# Altium footprint library PcbLib.PcbLib: 428 footprints (part 21 of 27)
Each footprint in its own frame and in the unit in brackets; x right, y up, seen from the top. Pads: shape width x height; smd on the part's side, far side on the other; paste and mask are expansions set on the pad; w line width, h text height; cw(c..) or ccw(c..) is an arc to the next point about the centre after c.
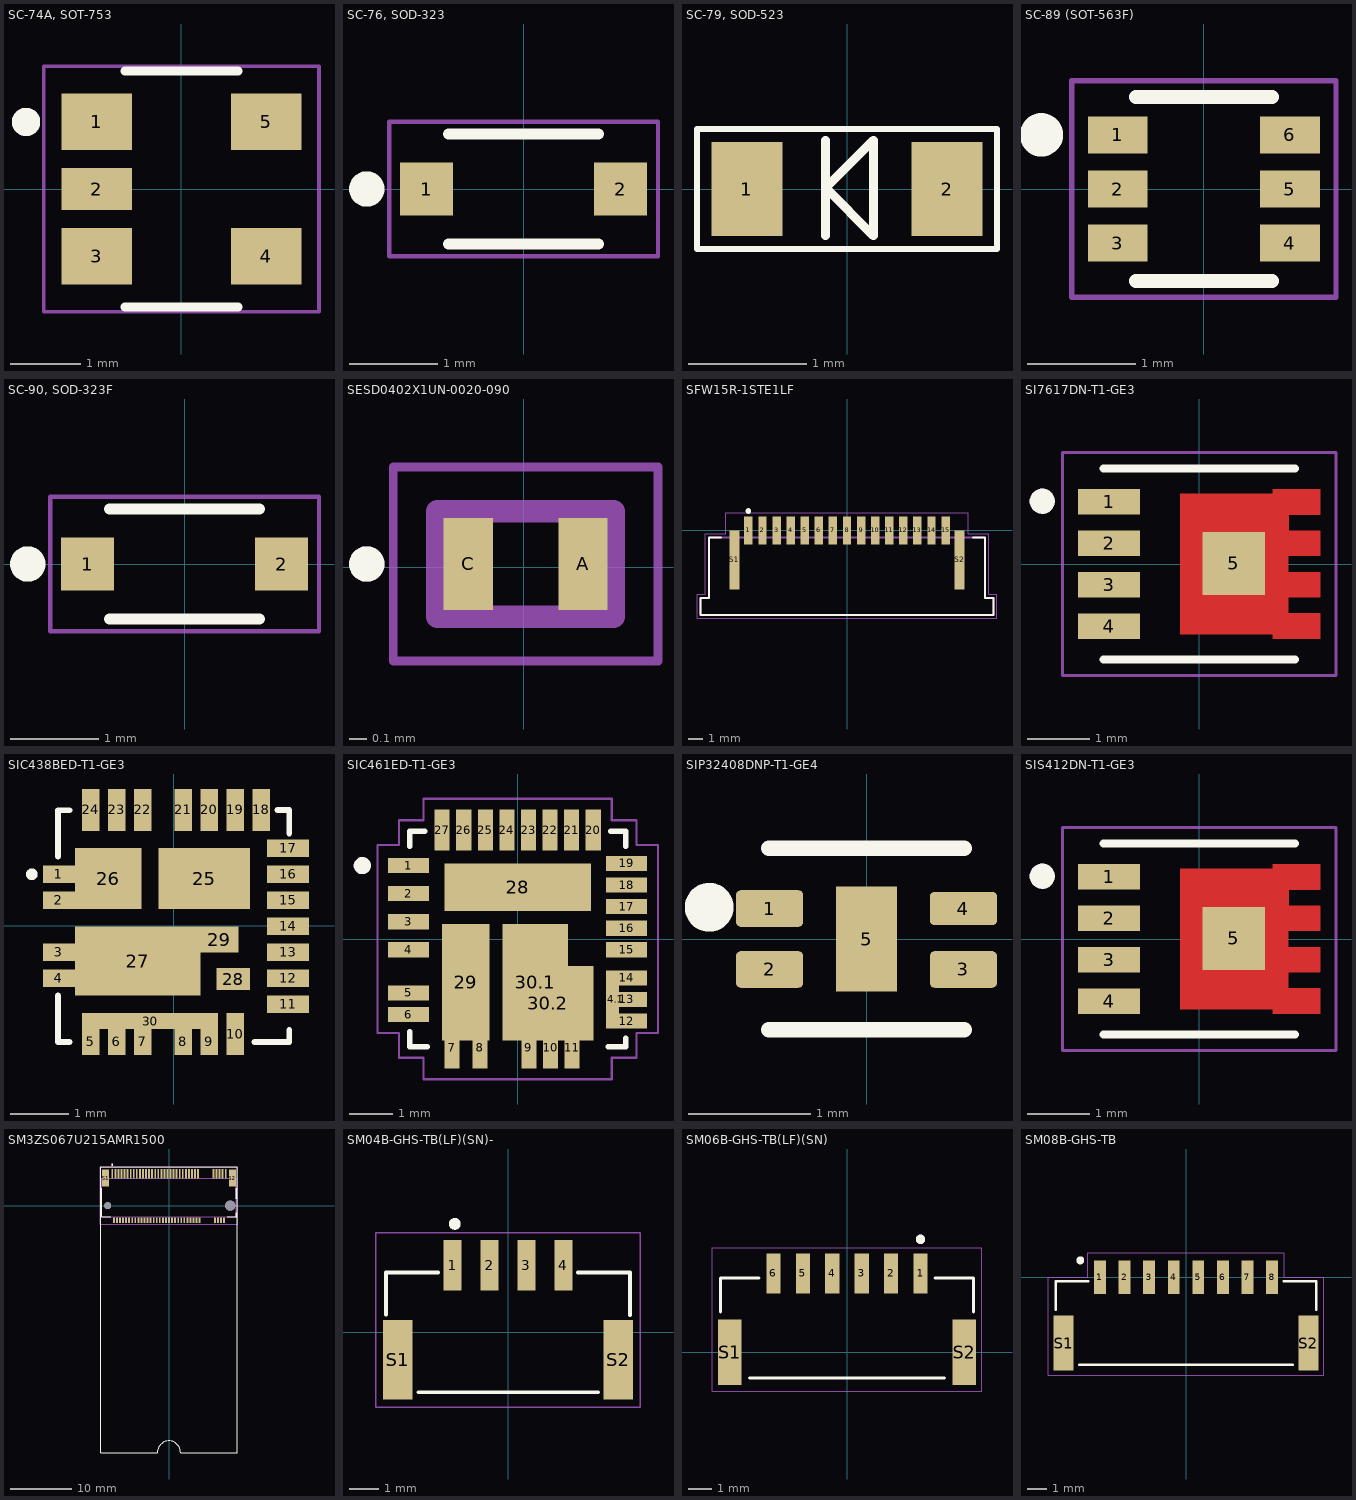
[diagram p20: the footprints below, top view; thin cyan lines are the x and y axes]

## SC-74A, SOT-753 [mm]
pads (5):
  rect 1x0.8 smd: 1(-1.2,0.95) 3(-1.2,-0.95) 4(1.2,-0.95) 5(1.2,0.95)
  rect 1x0.6 smd: 2(-1.2,0)
Top Overlay:
  circle w0.2: c-2.2,0.95 r0.1
  lines w0.127: -0.8,-1.67 0.8,-1.67 ; -0.8,1.67 0.8,1.67
Mechanical 13:
  circle w0.2: c-2.2,0.95 r0.1
Mechanical 15:
  lines w0.05: -1.95,-1.74 1.95,-1.74 1.95,1.74 -1.95,1.74 -1.95,-1.74
3D body "step_temp.STEP": height 1.3, standoff 0, extent -1.45,-1.4 1.45,1.4

## SC-76, SOD-323 [mm]
pads (2):
  rect 0.6x0.6 smd paste-1: 1(-1.1,0) 2(1.1,0)
Top Overlay:
  circle w0.2: c-1.778,0 r0.1
  lines w0.127: -0.85,-0.625 0.85,-0.625 ; -0.85,0.625 0.85,0.625
Top Paste:
  region: -0.85,-0.25 -1.35,-0.25 -1.35,0.25 -0.85,0.25
  region: 1.35,-0.25 0.85,-0.25 0.85,0.25 1.35,0.25
Mechanical 15:
  lines w0.05: -1.524,-0.762 -1.524,0.762 1.524,0.762 1.524,-0.762 -1.524,-0.762
3D body "User Library-SOD323.STEP": height 1, standoff 0.01, extent -1.275,-0.615 1.225,0.635

## SC-79, SOD-523 [mm]
pads (2):
  rect 0.6x0.8 smd: 1(-0.847,0) 2(0.847,0)
Top Overlay:
  lines w0.05: -1.27,-0.508 -1.27,0.508 1.27,0.508 1.27,-0.508 -1.27,-0.508
  lines w0.076: -0.182,-0.395 -0.182,0.413 ; -0.182,0.009 0.222,0.413 0.222,-0.395 -0.182,0.009
3D body "step_temp.STEP": height 0.7, standoff 0, extent -0.8,-0.4 0.8,0.4

## SC-89 (SOT-563F) [mm]
pads (6):
  rect 0.55x0.34 smd: 1(-0.795,0.5) 2(-0.795,0) 3(-0.795,-0.5) 4(0.795,-0.5) 5(0.795,0) 6(0.795,0.5)
Top Overlay:
  circle w0.3: c-1.5,0.5 r0.05
  lines w0.127: -0.63,-0.85 0.63,-0.85 ; -0.63,0.85 0.63,0.85
Mechanical 15:
  lines w0.05: -1.22,-1 1.22,-1 1.22,1 -1.22,1 -1.22,-1
3D body "DMG1024UV-7.STEP": height 0.6, standoff 0, extent -0.795,-0.82 0.805,0.78

## SC-90, SOD-323F [mm]
pads (2):
  rect 0.6x0.6 smd paste-1: 1(-1.1,0) 2(1.1,0)
Top Overlay:
  circle w0.2: c-1.778,0 r0.1
  lines w0.127: -0.85,-0.625 0.85,-0.625 ; -0.85,0.625 0.85,0.625
Top Paste:
  region: -0.85,-0.25 -1.35,-0.25 -1.35,0.25 -0.85,0.25
  region: 1.35,-0.25 0.85,-0.25 0.85,0.25 1.35,0.25
Mechanical 15:
  lines w0.05: -1.524,-0.762 -1.524,0.762 1.524,0.762 1.524,-0.762 -1.524,-0.762
3D body "step_temp.STEP": height 0.8, standoff 0, extent -1.25,-0.625 1.25,0.625

## SESD0402X1UN-0020-090 [mm]
pads (2):
  rect 0.28x0.52 smd: A(0.336,0.017) C(-0.314,0.017)
Top Overlay:
  circle w0.1: c-0.889,0.017 r0.05
Mechanical 13:
  circle w0.1: c-0.889,0.017 r0.05
  lines w0.127: -0.489,-0.283 0.511,-0.283 0.511,0.317 -0.489,0.317 -0.489,-0.283
Mechanical 15:
  lines w0.05: -0.739,-0.533 -0.739,0.567 0.761,0.567 0.761,-0.533 -0.739,-0.533
3D body "step_temp.STEP": height 0.43, standoff 0, extent -0.489,-0.283 0.511,0.317

## SFW15R-1STE1LF [mm]
pads (17):
  rect 0.6x2 smd: 1(-7,0) 2(-6,0) 3(-5,0) 4(-4,0) 5(-3,0) 6(-2,0) 7(-1,0) 8(0,0) 9(1,0) 10(2,0) 11(3,0) 12(4,0) 13(5,0) 14(6,0) 15(7,0)
  rect 0.7x4.2 smd: S1(-8,-2.1) S2(8,-2.1)
Top Overlay:
  circle w0.2: c-7,1.373 r0.1
  lines w0.127: -8.946,-0.5 -9.8,-0.5 -9.8,-4.8 -10.4,-4.8 -10.4,-6 10.4,-6 10.4,-4.8 9.8,-4.8 9.8,-0.5 8.946,-0.5
Mechanical 13:
  lines w0.127: -10.4,-6 10.4,-6 10.4,-4.8 9.8,-4.8 9.8,-0.5 -9.8,-0.5 -9.8,-4.8 -10.4,-4.8 -10.4,-6
Mechanical 15:
  lines w0.05: -10.65,-6.25 10.65,-6.25 10.65,-4.55 10.05,-4.55 10.05,-0.25 8.6,-0.25 8.6,1.25 -8.6,1.25 -8.6,-0.25 -10.05,-0.25 -10.05,-4.55 -10.65,-4.55 -10.65,-6.25
3D body "SFW15R-1STE1LF--3DModel-STEP-533217.STEP": height 2.79, standoff 0.09, extent -10.4,-6 10.4,0.5

## SI7617DN-T1-GE3 [mm]
height 1.12
pads (5):
  rect 0.99x0.405 smd: 1(-1.435,0.99) 2(-1.435,0.33) 3(-1.435,-0.33) 4(-1.435,-0.99)
  rect 1x1 smd paste-1 mask+0: 5(0.55,0.01)
Top Layer:
  region: 1.93,0.787 1.425,0.787 1.425,0.533 1.93,0.533 1.93,0.128 1.42,0.128 1.42,-0.128 1.93,-0.128 1.93,-0.533 1.42,-0.533 1.42,-0.787 1.93,-0.787 1.93,-1.195 1.17,-1.195 1.17,-1.118 -0.305,-1.118 -0.305,1.118 1.17,1.118 1.17,1.195 1.93,1.195
Top Overlay:
  circle w0.2: c-2.5,1 r0.1
  lines w0.127: -1.525,-1.525 1.525,-1.525 ; -1.525,1.525 1.525,1.525
Top Paste:
  region: 1.93,-0.533 1.17,-0.533 1.17,-0.128 1.93,-0.128
  region: 1.93,0.128 1.17,0.128 1.17,0.533 1.93,0.533
  region: 1.93,0.787 1.17,0.787 1.17,1.195 1.93,1.195
  region: 1.93,-1.195 1.17,-1.195 1.17,-0.787 1.93,-0.787
  region: 0.913,0.085 -0.048,0.085 -0.048,0.945 0.913,0.945
  region: 0.913,-0.945 -0.048,-0.945 -0.048,-0.085 0.913,-0.085
Top Solder:
  region: 1.98,0.737 1.475,0.737 1.475,0.583 1.98,0.583 1.98,0.078 1.47,0.078 1.47,-0.078 1.98,-0.078 1.98,-0.583 1.47,-0.583 1.47,-0.737 1.98,-0.737 1.98,-1.245 1.12,-1.245 1.12,-1.168 -0.355,-1.168 -0.355,1.168 1.12,1.168 1.12,1.245 1.98,1.245
Mechanical 13:
  circle w0.2: c-2.5,1 r0.1
Mechanical 15:
  lines w0.05: -2.18,-1.775 2.18,-1.775 2.18,1.775 -2.18,1.775 -2.18,-1.775
3D body "SIS412DN-T1-GE3.STEP": height 1.12, standoff 0, extent -1.651,-1.651 1.651,1.651

## SIC438BED-T1-GE3 [mm]
pads (30):
  rect 0.55x0.3 smd: 1(-1.981,0.894) 2(-1.981,0.444) 3(-1.981,-0.456) 4(-1.981,-0.906)
  rect 0.3x0.45 smd: 5(-1.431,-2.006) 6(-0.981,-2.006) 7(-0.531,-2.006) 8(0.169,-2.006) 9(0.619,-2.006)
  rect 0.3x0.725 smd: 10(1.069,-1.869) 18(1.519,2.006) 19(1.069,2.006) 20(0.619,2.006) 21(0.169,2.006) 22(-0.531,2.006) 23(-0.981,2.006) 24(-1.431,2.006)
  rect 0.725x0.3 smd: 11(1.981,-1.356) 12(1.981,-0.906) 13(1.981,-0.456) 14(1.981,-0.006) 15(1.981,0.444) 16(1.981,0.894) 17(1.981,1.344)
  rect 1.575x1.05 smd: 25(0.531,0.819)
  rect 1.15x1.05 smd: 26(-1.131,0.819)
  rect 2.175x1.2 smd: 27(-0.619,-0.606)
  rect 0.58x0.38 smd: 28(1.029,-0.921)
  rect 0.66x0.455 smd: 29(0.794,-0.234)
  rect 2.35x0.275 smd: 30(-0.406,-1.644)
Top Overlay:
  lines w0.1: -2,-1.2 -2,-2.006 -1.8,-2.006 ; -2,1.2 -2,2 -1.8,2 ; 1.4,-2.006 2,-2.006 2,-1.8 ; 1.8,2.006 2,2.006 2,1.6 ; -2.5,0.894 cw(c-2.45,0.894) -2.4,0.894 cw(c-2.45,0.894) -2.5,0.894
3D body "SIC437BED-T1-GE3.STEP": height 0.8, standoff 0, extent -1.975,-2 2.025,2

## SIC461ED-T1-GE3 [mm]
pads (32):
  rect 0.95x0.35 smd: 1(-2.525,1.7) 2(-2.525,1.05) 3(-2.525,0.4) 4(-2.525,-0.25) 5(-2.525,-1.25) 6(-2.525,-1.75) 12(2.525,-1.9) 13(2.525,-1.4) 14(2.525,-0.9) 15(2.525,-0.25) 16(2.525,0.25) 17(2.525,0.75) 18(2.525,1.25) 19(2.525,1.75)
  rect 0.35x0.95 smd: 7(-1.52,-2.525) 8(-0.87,-2.525) 9(0.26,-2.525) 10(0.76,-2.525) 11(1.26,-2.525) 20(1.75,2.525) 21(1.25,2.525) 22(0.75,2.525) 23(0.25,2.525) 24(-0.25,2.525) 25(-0.75,2.525) 26(-1.25,2.525) 27(-1.75,2.525)
  rect 0.3x1.35 smd: 14.1(2.2,-1.4)
  rect 3.4x1.1 smd: 28(0,1.2)
  rect 1.1x2.7 smd: 29(-1.2,-1)
  rect 1.52x2.7 smd: 30.1(0.41,-1)
  rect 2.1x1.73 smd: 30.2(0.7,-1.485)
Top Overlay:
  circle w0.2: c-3.6,1.7 r0.1
  lines w0.127: -2.5,-2.15 -2.5,-2.5 -2.1,-2.5 ; -2.5,2.15 -2.5,2.5 -2.15,2.5 ; 2.1,-2.5 2.5,-2.5 2.5,-2.3 ; 2.15,2.5 2.5,2.5 2.5,2.15
Mechanical 15:
  lines w0.05: -3.25,-2.18 -2.75,-2.18 -2.75,-2.75 -2.18,-2.75 -2.18,-3.25 2.18,-3.25 2.18,-2.75 2.75,-2.75 2.75,-2.18 3.25,-2.18 3.25,2.18 2.75,2.18 2.75,2.75 2.18,2.75 2.18,3.25 -2.18,3.25 -2.18,2.75 -2.75,2.75 -2.75,2.18 -3.25,2.18 -3.25,-2.18
3D body "SIC461ED-T1-GE3--3DModel-STEP-56544.STEP": height 0.8, standoff 0, extent -2.5,-2.5 2.5,2.5

## SIP32408DNP-T1-GE4 [mm]
pads (5):
  rrect25% 0.55x0.3 smd mask+0: 1(-0.795,0.25) 2(-0.795,-0.25) 3(0.795,-0.25)
  rrect25% 0.55x0.27 smd mask+0: 4(0.795,0.25)
  rect 0.5x0.86 smd paste-1 mask+0.05: 5(0,0)
Top Overlay:
  circle w0.2: c-1.29,0.26 r0.1
  lines w0.127: -0.8,-0.744 0.8,-0.744 ; -0.8,0.744 0.8,0.744
Top Paste:
  region: 0.16,-0.27 -0.16,-0.27 -0.16,0.27 0.16,0.27
3D body "TDFN_8DNP-T1-GE4_VIS.step": height 0.61, standoff 0, extent -0.836,-0.632 0.816,0.612

## SIS412DN-T1-GE3 [mm]
height 1.12
pads (5):
  rect 0.99x0.405 smd: 1(-1.435,0.99) 2(-1.435,0.33) 3(-1.435,-0.33) 4(-1.435,-0.99)
  rect 1x1 smd paste-1 mask+0: 5(0.55,0.01)
Top Layer:
  region: 1.93,0.787 1.425,0.787 1.425,0.533 1.93,0.533 1.93,0.128 1.42,0.128 1.42,-0.128 1.93,-0.128 1.93,-0.533 1.42,-0.533 1.42,-0.787 1.93,-0.787 1.93,-1.195 1.17,-1.195 1.17,-1.118 -0.305,-1.118 -0.305,1.118 1.17,1.118 1.17,1.195 1.93,1.195
Top Overlay:
  circle w0.2: c-2.5,1 r0.1
  lines w0.127: -1.525,-1.525 1.525,-1.525 ; -1.525,1.525 1.525,1.525
Top Paste:
  region: 0.913,-0.945 -0.048,-0.945 -0.048,-0.085 0.913,-0.085
  region: 0.913,0.085 -0.048,0.085 -0.048,0.945 0.913,0.945
  region: 1.93,-1.195 1.17,-1.195 1.17,-0.787 1.93,-0.787
  region: 1.93,0.787 1.17,0.787 1.17,1.195 1.93,1.195
  region: 1.93,0.128 1.17,0.128 1.17,0.533 1.93,0.533
  region: 1.93,-0.533 1.17,-0.533 1.17,-0.128 1.93,-0.128
Top Solder:
  region: 1.98,0.737 1.475,0.737 1.475,0.583 1.98,0.583 1.98,0.078 1.47,0.078 1.47,-0.078 1.98,-0.078 1.98,-0.583 1.47,-0.583 1.47,-0.737 1.98,-0.737 1.98,-1.245 1.12,-1.245 1.12,-1.168 -0.355,-1.168 -0.355,1.168 1.12,1.168 1.12,1.245 1.98,1.245
Mechanical 13:
  circle w0.2: c-2.5,1 r0.1
Mechanical 15:
  lines w0.05: -2.18,-1.775 -2.18,1.775 2.18,1.775 2.18,-1.775 -2.18,-1.775
3D body "SIS412DN-T1-GE3.STEP": height 1.12, standoff 0, extent -1.651,-1.651 1.651,1.651

## SM3ZS067U215AMR1500 [mm]
height 2.25
pads (71):
  rect 0.3x1.55 smd: 1(-9.25,5.225) 3(-8.75,5.225) 5(-8.25,5.225) 7(-7.75,5.225) 9(-7.25,5.225) 11(-6.75,5.225) 13(-6.25,5.225) 15(-5.75,5.225) 17(-5.25,5.225) 19(-4.75,5.225) 21(-4.25,5.225) 23(-3.75,5.225) 25(-3.25,5.225) 27(-2.75,5.225) 29(-2.25,5.225) 31(-1.75,5.225) 33(-1.25,5.225) 35(-0.75,5.225) 37(-0.25,5.225) 39(0.25,5.225) 41(0.75,5.225) 43(1.25,5.225) 45(1.75,5.225) 47(2.25,5.225) 49(2.75,5.225) 51(3.25,5.225) 53(3.75,5.225) 55(4.25,5.225) 57(4.75,5.225) 67(7.25,5.225) 69(7.75,5.225) 71(8.25,5.225) 73(8.75,5.225) 75(9.25,5.225)
  rect 0.3x0.85 smd: 2(-9,-2.375) 4(-8.5,-2.375) 6(-8,-2.375) 8(-7.5,-2.375) 10(-7,-2.375) 12(-6.5,-2.375) 14(-6,-2.375) 16(-5.5,-2.375) 18(-5,-2.375) 20(-4.5,-2.375) 22(-4,-2.375) 24(-3.5,-2.375) 26(-3,-2.375) 28(-2.5,-2.375) 30(-2,-2.375) 32(-1.5,-2.375) 34(-1,-2.375) 36(-0.5,-2.375) 38(0,-2.375) 40(0.5,-2.375) 42(1,-2.375) 44(1.5,-2.375) 46(2,-2.375) 48(2.5,-2.375) 50(3,-2.375) 52(3.5,-2.375) 54(4,-2.375) 56(4.5,-2.375) 58(5,-2.375) 68(7.5,-2.375) 70(8,-2.375) 72(8.5,-2.375) 74(9,-2.375)
  rect 1.2x2.75 smd: S1(-10.35,4.5) S2(10.35,4.5)
  round 1.15 hole 1.15 unplated: ""(-10,0)
  round 1.65 hole 1.65 unplated: ""(10,0)
Top Overlay:
  circle w0.2: c-9.25,6.7 r0.1
  lines w0.2: -10.95,2.805 -10.95,-1.83 -9.47,-1.83 ; 9.47,-1.83 10.95,-1.83 10.95,-1.145 ; 10.95,1.145 10.95,2.805 ; -11.123,-40.27 -5.561,-40.27 -1.9,-40.27 cw(c-0.01,-40.256) 1.88,-40.27 5.563,-40.27 11.125,-40.27 11.125,6.39 -11.123,6.39 -11.123,-40.27
Mechanical 13:
  circle w0.2: c-9.25,6.7 r0.1
  lines w0.127: -10.95,-1.83 -10.95,4.5 10.95,4.5 10.95,-1.83 -10.95,-1.83
Mechanical 15:
  lines w0.05: -11.2,-3.05 11.2,-3.05 11.2,6.25 -11.2,6.25 -11.2,-3.05
3D body "step_temp.STEP": height 2.15, standoff -0.64, extent -10.95,-2.45 10.95,5.15
3D body "SSD.STEP": height 2.5, standoff 0.64, extent -11.02,-40.15 10.98,1.85

## SM04B-GHS-TB(LF)(SN)- [mm] "JST"
pads (6):
  rect 0.6x1.7 smd: 1(-1.875,2.275) 2(-0.625,2.275) 3(0.625,2.275) 4(1.875,2.275)
  rect 1x2.7 smd: S1(-3.725,-0.925) S2(3.725,-0.925)
Top Overlay:
  circle w0.2: c-1.8,3.675 r0.1
  lines w0.127: -4.125,0.605 -4.125,2.025 -2.36,2.025 ; -3.04,-2.025 3.05,-2.025 ; 2.36,2.025 4.125,2.025 4.125,0.595
Mechanical 13:
  circle w0.2: c-1.8,2.675 r0.1
Mechanical 15:
  lines w0.05: -4.475,-2.525 -4.475,3.375 4.475,3.375 4.475,-2.525 -4.475,-2.525
3D body "SM04B-GHS-TB(LF)(SN)---3DModel-STEP-56544.STEP": height 4.35, standoff 0, extent -4.125,-2.032 4.125,2.818

## SM06B-GHS-TB(LF)(SN) [mm]
pads (8):
  rect 0.6x1.7 smd: 1(3.125,3.35) 2(1.875,3.35) 3(0.625,3.35) 4(-0.625,3.35) 5(-1.875,3.35) 6(-3.125,3.35)
  rect 1x2.8 smd: S1(-4.975,0) S2(4.975,0)
Top Overlay:
  circle w0.2: c3.125,4.8 r0.1
  lines w0.127: -5.375,1.72 -5.375,3.15 -3.75,3.15 ; -4.15,-1.1 4.15,-1.1 ; 3.75,3.15 5.375,3.15 5.375,1.72
Mechanical 13:
  circle w0.2: c3.125,4.8 r0.1
Mechanical 15:
  lines w0.05: -5.725,-1.65 -5.725,4.45 5.725,4.45 5.725,-1.65 -5.725,-1.65
3D body "SM06B-GEZS-TB.STEP": height 4.45, standoff 0.1, extent -5.355,-1.12 5.395,3.73

## SM08B-GHS-TB [mm]
pads (10):
  rect 0.6x1.7 smd: 1(-4.375,0) 2(-3.125,0) 3(-1.875,0) 4(-0.625,0) 5(0.625,0) 6(1.875,0) 7(3.125,0) 8(4.375,0)
  rect 1x2.8 smd: S1(-6.225,-3.35) S2(6.225,-3.35)
Top Overlay:
  circle w0.2: c-5.374,0.853 r0.1
  lines w0.127: -6.625,-1.65 -6.625,-0.2 -4.975,-0.2 ; -5.425,-4.45 5.425,-4.45 ; 4.975,-0.2 6.625,-0.2 6.625,-1.65
Mechanical 15:
  lines w0.05: -7,-5 7,-5 7,0 5,0 5,1.25 -5,1.25 -5,0 -7,0 -7,-5
3D body "GHR-08V-S.STEP": height 4.2, standoff 0.05, extent -5.625,-7.402 5.625,-1.702
3D body "SM08B-GEZS-TB.STEP": height 4.25, standoff -0.1, extent -6.625,-4.48 6.625,0.37